# Altium footprint library PcbLib_ICs.PcbLib: 317 footprints (part 12 of 24)
Each footprint in its own frame and in the unit in brackets; x right, y up, seen from the top. Pads: shape width x height; smd on the part's side, far side on the other; paste and mask are expansions set on the pad; w line width, h text height; cw(c..) or ccw(c..) is an arc to the next point about the centre after c.
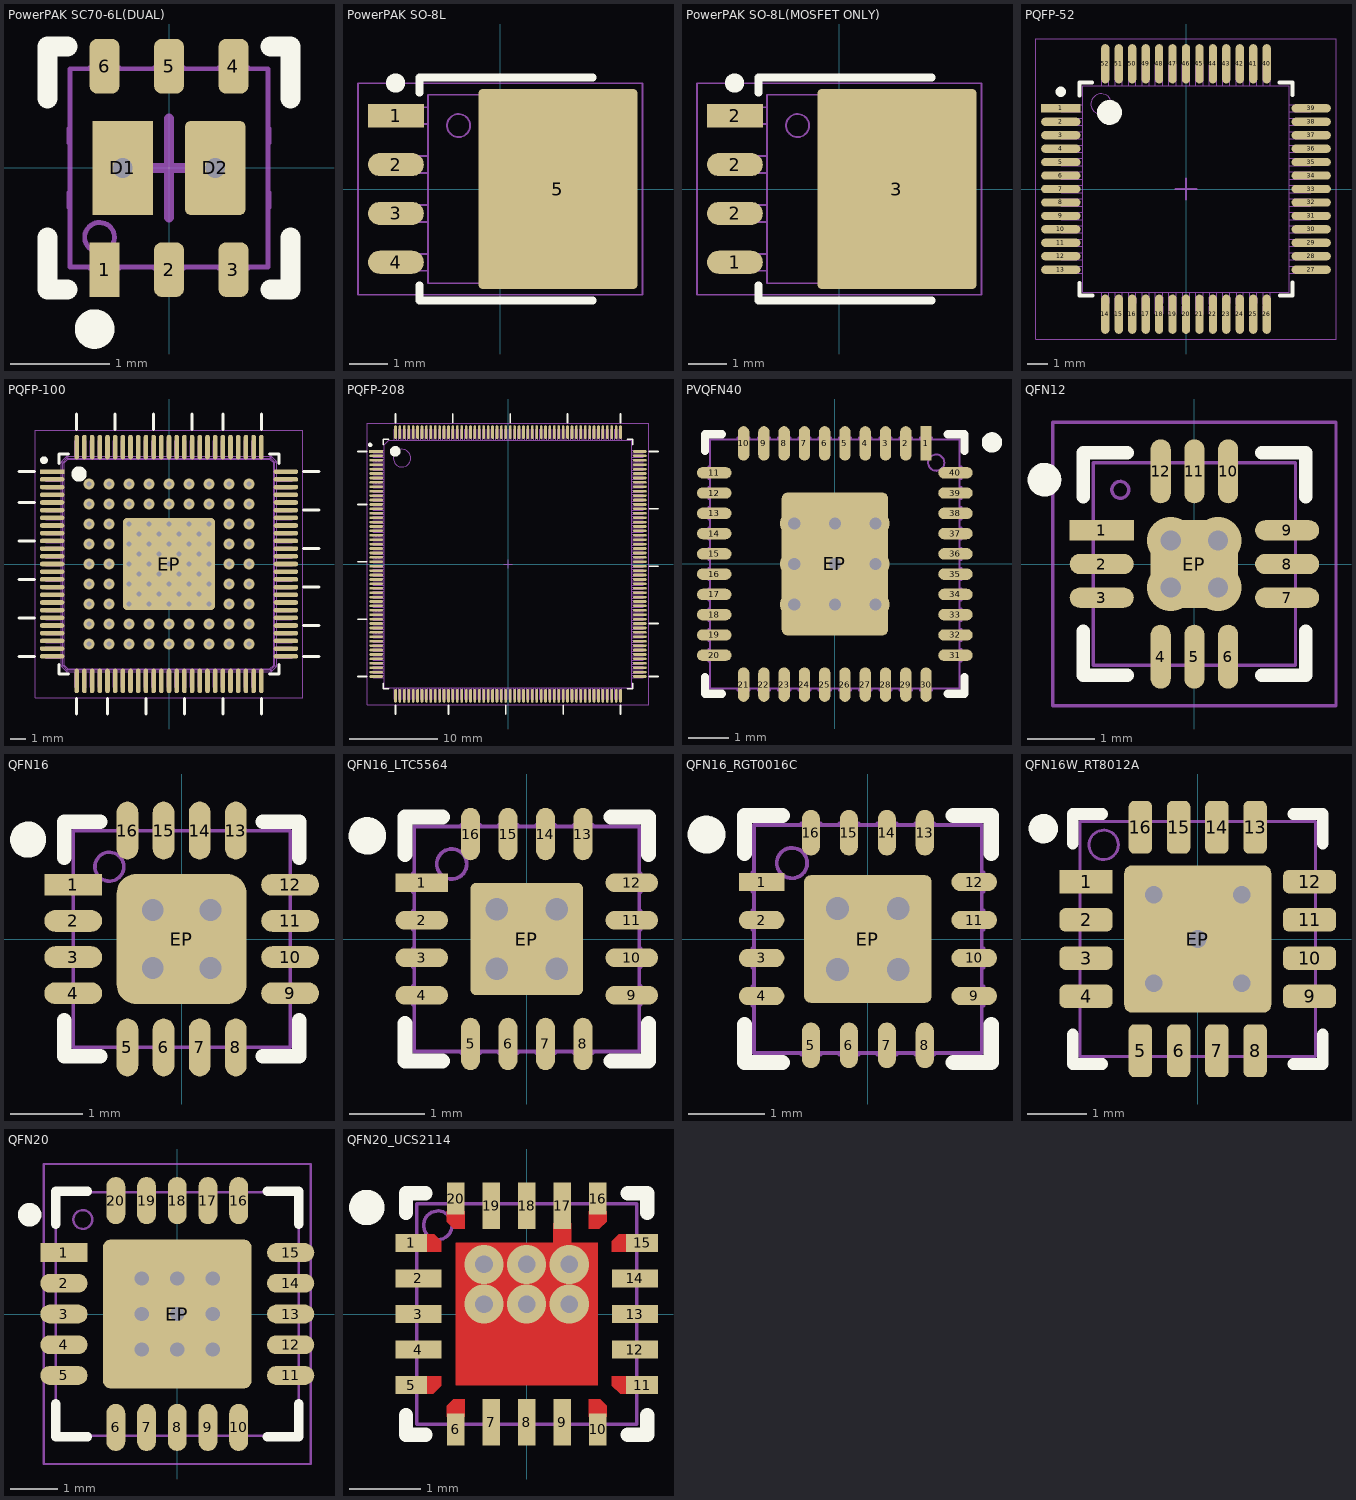
[diagram p11: the footprints below, top view; thin cyan lines are the x and y axes]

## PowerPAK SC70-6L(DUAL) [mm]
height 0.75
pads (8):
  rect 0.3x0.55 smd paste+0 mask+0.05: 1(-0.65,-1.025)
  rrect50% 0.3x0.55 smd paste+0 mask+0.05: 2(0,-1.025) 3(0.65,-1.025) 4(0.65,1.025) 5(0,1.025) 6(-0.65,1.025)
  rect 0.613x0.95 smd paste-2 mask+0.05: D1(-0.466,0)
  rrect20% 0.613x0.95 smd paste-2 mask+0.05: D2(0.466,0)
via -0.466,0 diameter 0.5 hole 0.2
via 0.466,0 diameter 0.5 hole 0.2
Top Overlay:
  circle w0.2: c-0.75,-1.625 r0.1
  lines w0.2: -1.225,-0.7 -1.225,-1.225 -1.025,-1.225 ; -1.225,0.7 -1.225,1.225 -1.025,1.225 ; 1.025,-1.225 1.225,-1.225 1.225,-0.7 ; 1.025,1.225 1.225,1.225 1.225,0.7
Top Paste:
  rectangle: 0.132,-0.5 0.797,0.5
  rectangle: -0.8,-0.5 -0.135,0.5
Top Assy:
  circle w0.05: c-0.7,-0.7 r0.15
  lines w0.05: -1,-0.4 -1.01,-0.4 -1.01,-0.25 -1,-0.25 ; -1,0.25 -1.01,0.25 -1.01,0.4 -1,0.4 ; -0.8,-1 -0.8,-1.01 -0.5,-1.01 -0.5,-1 ; -0.8,1 -0.8,1.01 -0.5,1.01 -0.5,1 ; -0.15,-1 -0.15,-1.01 0.15,-1.01 0.15,-1 ; -0.15,1 -0.15,1.01 0.15,1.01 0.15,1 ; 0.5,-1 0.5,-1.01 0.8,-1.01 0.8,-1 ; 0.5,1 0.5,1.01 0.8,1.01 0.8,1 ; 1,-0.4 1.01,-0.4 1.01,-0.25 1,-0.25 ; 1,0.25 1.01,0.25 1.01,0.4 1,0.4 ; -1,-1 -1,1 1,1 1,-1 -1,-1
  text ".Designator" at -2.579,-0.349 h1.5
Top Text:
  lines w0.1: -0.5,0 0.5,0 ; 0,-0.5 0,0.5
3D body "PowerPAK_SC70_6L.STEP": height 0.75, standoff -0.01, extent -1.025,-1.035 1.025,1.035

## PowerPAK SO-8L [mm] "PowerPAK SO-8L single package"
height 1.75
pads (5):
  rect 1.45x0.6 smd paste+0 mask+0.05: 1(-2.715,1.905)
  oval 1.45x0.6 smd paste+0 mask+0.05: 2(-2.715,0.635) 3(-2.715,-0.635) 4(-2.715,-1.905)
  rrect5% 4.13x5.2 smd paste-5 mask+0.05: 5(1.5,0)
Top Overlay:
  circle w0.25: c-2.725,2.755 r0.125
  lines w0.2: -2.1,-2.5 -2.1,-2.9 2.4,-2.9 ; -2.1,2.5 -2.1,2.9 2.4,2.9
Top Paste:
  rectangle: -0.4,1.6 0.4,2.4
  rectangle: 0.6,1.6 1.4,2.4
  rectangle: 0.6,0.6 1.4,1.4
  rectangle: -0.4,0.6 0.4,1.4
  rectangle: 0.6,-0.4 1.4,0.4
  rectangle: -0.4,-0.4 0.4,0.4
  region: 3.4,2.4 2.6,2.4 2.6,1.6 3.4,1.6
  region: 2.4,2.4 1.6,2.4 1.6,1.6 2.4,1.6
  region: 2.4,1.4 1.6,1.4 1.6,0.6 2.4,0.6
  region: 3.4,1.4 2.6,1.4 2.6,0.6 3.4,0.6
  region: 2.4,0.4 1.6,0.4 1.6,-0.4 2.4,-0.4
  region: 3.4,0.4 2.6,0.4 2.6,-0.4 3.4,-0.4
  rectangle: -0.4,-1.4 0.4,-0.6
  rectangle: 0.6,-1.4 1.4,-0.6
  rectangle: 0.6,-2.4 1.4,-1.6
  rectangle: -0.4,-2.4 0.4,-1.6
  region: 3.4,-0.6 2.6,-0.6 2.6,-1.4 3.4,-1.4
  region: 2.4,-0.6 1.6,-0.6 1.6,-1.4 2.4,-1.4
  region: 2.4,-1.6 1.6,-1.6 1.6,-2.4 2.4,-2.4
  region: 3.4,-1.6 2.6,-1.6 2.6,-2.4 3.4,-2.4
Top Assy:
  circle w0.05: c-1.085,1.65 r0.3
  lines w0.05: -1.885,-2.125 -2.244,-2.125 ; -1.885,-1.685 -2.244,-1.685 ; -1.885,-0.855 -2.244,-0.855 ; -1.885,-0.415 -2.244,-0.415 ; -1.885,0.415 -2.244,0.415 ; -1.885,0.855 -2.244,0.855 ; -1.885,1.685 -2.244,1.685 ; -1.885,2.125 -2.244,2.125 ; 0.125,-2.45 0.125,-2.56 0.235,-2.56 0.235,-2.45 ; 0.125,2.45 0.125,2.56 0.235,2.56 0.235,2.45 ; 2.485,-1.98 2.785,-1.98 2.785,-2.45 3.195,-2.45 3.195,2.45 2.785,2.45 2.785,1.98 2.485,1.98 ; 2.485,-1.52 2.785,-1.52 2.785,1.52 2.485,1.52 ; -2.633,-2.125 -2.544,-2.125 ; -2.633,-2.125 -2.955,-2.125 -2.955,-1.685 -2.633,-1.685 ; -2.633,-2.125 -2.633,-1.685 ; -2.633,-1.685 -2.544,-1.685 ; -2.633,-0.855 -2.544,-0.855 ; -2.633,-0.855 -2.955,-0.855 -2.955,-0.415 -2.633,-0.415 ; -2.633,-0.855 -2.633,-0.415 ; -2.633,-0.415 -2.544,-0.415 ; -2.633,0.415 -2.544,0.415 ; -2.633,0.415 -2.955,0.415 -2.955,0.855 -2.633,0.855 ; -2.633,0.415 -2.633,0.855 ; -2.633,0.855 -2.544,0.855 ; -2.633,1.685 -2.544,1.685 ; -2.633,1.685 -2.955,1.685 -2.955,2.125 -2.633,2.125 ; -2.633,1.685 -2.633,2.125 ; -2.633,2.125 -2.544,2.125 ; -2.544,-2.125 -2.333,-2.125 ; -2.544,-2.125 -2.544,-1.685 ; -2.544,-1.685 -2.333,-1.685 ; -2.544,-0.855 -2.333,-0.855 ; -2.544,-0.855 -2.544,-0.415 ; -2.544,-0.415 -2.333,-0.415 ; -2.544,0.415 -2.333,0.415 ; -2.544,0.415 -2.544,0.855 ; -2.544,0.855 -2.333,0.855 ; -2.544,1.685 -2.333,1.685 ; -2.544,1.685 -2.544,2.125 ; -2.544,2.125 -2.333,2.125 ; -2.333,-2.125 -2.244,-2.125 ; -2.333,-2.125 -2.333,-1.685 ; -2.333,-1.685 -2.244,-1.685 ; -2.333,-0.855 -2.244,-0.855 ; -2.333,-0.855 -2.333,-0.415 ; -2.333,-0.415 -2.244,-0.415 ; -2.333,0.415 -2.244,0.415 ; -2.333,0.415 -2.333,0.855 ; -2.333,0.855 -2.244,0.855 ; -2.333,1.685 -2.244,1.685 ; -2.333,1.685 -2.333,2.125 ; -2.333,2.125 -2.244,2.125 ; -2.244,-2.125 -2.244,-1.685 ; -2.244,-0.855 -2.244,-0.415 ; -2.244,0.415 -2.244,0.855 ; -2.244,1.685 -2.244,2.125 ; -1.885,-2.45 2.485,-2.45 2.485,2.45 -1.885,2.45 -1.885,-2.45
  text ".Designator" at -3.443,-0.467 h2
Top Text:
  lines w0.05: -3.7,-2.75 -3.7,2.75 3.7,2.75 3.7,-2.75 -3.7,-2.75
  lines w0.1: -0.5,0 0.5,0 ; 0,-0.5 0,0.5
3D body "User Library-PowerPAK_SO-8L_SINGLE.STEP": height 1.1, standoff 0.03, extent -2.955,-2.56 3.195,2.56

## PowerPAK SO-8L(MOSFET ONLY) [mm] "PowerPAK SO-8L single package (1-S,2-G,3-D)"
height 1.75
pads (5):
  oval 1.45x0.6 smd paste+0 mask+0.05: 1(-2.715,-1.905) 2(-2.715,-0.635) 2(-2.715,0.635)
  rect 1.45x0.6 smd paste+0 mask+0.05: 2(-2.715,1.905)
  rrect5% 4.13x5.2 smd paste-5 mask+0.05: 3(1.5,0)
Top Overlay:
  circle w0.25: c-2.725,2.755 r0.125
  lines w0.2: -2.1,-2.5 -2.1,-2.9 2.4,-2.9 ; -2.1,2.5 -2.1,2.9 2.4,2.9
Top Paste:
  rectangle: -0.4,1.6 0.4,2.4
  rectangle: 0.6,1.6 1.4,2.4
  rectangle: 0.6,0.6 1.4,1.4
  rectangle: -0.4,0.6 0.4,1.4
  rectangle: 0.6,-0.4 1.4,0.4
  rectangle: -0.4,-0.4 0.4,0.4
  region: 3.4,2.4 2.6,2.4 2.6,1.6 3.4,1.6
  region: 2.4,2.4 1.6,2.4 1.6,1.6 2.4,1.6
  region: 2.4,1.4 1.6,1.4 1.6,0.6 2.4,0.6
  region: 3.4,1.4 2.6,1.4 2.6,0.6 3.4,0.6
  region: 2.4,0.4 1.6,0.4 1.6,-0.4 2.4,-0.4
  region: 3.4,0.4 2.6,0.4 2.6,-0.4 3.4,-0.4
  rectangle: -0.4,-1.4 0.4,-0.6
  rectangle: 0.6,-1.4 1.4,-0.6
  rectangle: 0.6,-2.4 1.4,-1.6
  rectangle: -0.4,-2.4 0.4,-1.6
  region: 3.4,-0.6 2.6,-0.6 2.6,-1.4 3.4,-1.4
  region: 2.4,-0.6 1.6,-0.6 1.6,-1.4 2.4,-1.4
  region: 2.4,-1.6 1.6,-1.6 1.6,-2.4 2.4,-2.4
  region: 3.4,-1.6 2.6,-1.6 2.6,-2.4 3.4,-2.4
Top Assy:
  circle w0.05: c-1.085,1.65 r0.3
  lines w0.05: -1.885,-2.125 -2.244,-2.125 ; -1.885,-1.685 -2.244,-1.685 ; -1.885,-0.855 -2.244,-0.855 ; -1.885,-0.415 -2.244,-0.415 ; -1.885,0.415 -2.244,0.415 ; -1.885,0.855 -2.244,0.855 ; -1.885,1.685 -2.244,1.685 ; -1.885,2.125 -2.244,2.125 ; 0.125,-2.45 0.125,-2.56 0.235,-2.56 0.235,-2.45 ; 0.125,2.45 0.125,2.56 0.235,2.56 0.235,2.45 ; 2.485,-1.98 2.785,-1.98 2.785,-2.45 3.195,-2.45 3.195,2.45 2.785,2.45 2.785,1.98 2.485,1.98 ; 2.485,-1.52 2.785,-1.52 2.785,1.52 2.485,1.52 ; -2.633,-2.125 -2.544,-2.125 ; -2.633,-2.125 -2.955,-2.125 -2.955,-1.685 -2.633,-1.685 ; -2.633,-2.125 -2.633,-1.685 ; -2.633,-1.685 -2.544,-1.685 ; -2.633,-0.855 -2.544,-0.855 ; -2.633,-0.855 -2.955,-0.855 -2.955,-0.415 -2.633,-0.415 ; -2.633,-0.855 -2.633,-0.415 ; -2.633,-0.415 -2.544,-0.415 ; -2.633,0.415 -2.544,0.415 ; -2.633,0.415 -2.955,0.415 -2.955,0.855 -2.633,0.855 ; -2.633,0.415 -2.633,0.855 ; -2.633,0.855 -2.544,0.855 ; -2.633,1.685 -2.544,1.685 ; -2.633,1.685 -2.955,1.685 -2.955,2.125 -2.633,2.125 ; -2.633,1.685 -2.633,2.125 ; -2.633,2.125 -2.544,2.125 ; -2.544,-2.125 -2.333,-2.125 ; -2.544,-2.125 -2.544,-1.685 ; -2.544,-1.685 -2.333,-1.685 ; -2.544,-0.855 -2.333,-0.855 ; -2.544,-0.855 -2.544,-0.415 ; -2.544,-0.415 -2.333,-0.415 ; -2.544,0.415 -2.333,0.415 ; -2.544,0.415 -2.544,0.855 ; -2.544,0.855 -2.333,0.855 ; -2.544,1.685 -2.333,1.685 ; -2.544,1.685 -2.544,2.125 ; -2.544,2.125 -2.333,2.125 ; -2.333,-2.125 -2.244,-2.125 ; -2.333,-2.125 -2.333,-1.685 ; -2.333,-1.685 -2.244,-1.685 ; -2.333,-0.855 -2.244,-0.855 ; -2.333,-0.855 -2.333,-0.415 ; -2.333,-0.415 -2.244,-0.415 ; -2.333,0.415 -2.244,0.415 ; -2.333,0.415 -2.333,0.855 ; -2.333,0.855 -2.244,0.855 ; -2.333,1.685 -2.244,1.685 ; -2.333,1.685 -2.333,2.125 ; -2.333,2.125 -2.244,2.125 ; -2.244,-2.125 -2.244,-1.685 ; -2.244,-0.855 -2.244,-0.415 ; -2.244,0.415 -2.244,0.855 ; -2.244,1.685 -2.244,2.125 ; -1.885,-2.45 2.485,-2.45 2.485,2.45 -1.885,2.45 -1.885,-2.45
  text ".Designator" at -3.443,-0.467 h2
Top Text:
  lines w0.05: -3.7,-2.75 -3.7,2.75 3.7,2.75 3.7,-2.75 -3.7,-2.75
  lines w0.1: -0.5,0 0.5,0 ; 0,-0.5 0,0.5
3D body "User Library-PowerPAK_SO-8L_SINGLE.STEP": height 1.1, standoff 0.03, extent -2.955,-2.56 3.195,2.56

## PQFP-52 [mm] "QFP, 52-Leads, Body 10,00x10,00mm, Pitch 0,65mm, IPC Medium Density"
height 2.7
pads (52):
  rect 1.9x0.4 smd paste+0 mask+0.05: 1(-6.05,3.9)
  oval 1.9x0.4 smd paste+0 mask+0.05: 2(-6.05,3.25) 3(-6.05,2.6) 4(-6.05,1.95) 5(-6.05,1.3) 6(-6.05,0.65) 7(-6.05,0) 8(-6.05,-0.65) 9(-6.05,-1.3) 10(-6.05,-1.95) 11(-6.05,-2.6) 12(-6.05,-3.25) 13(-6.05,-3.9) 27(6.05,-3.9) 28(6.05,-3.25) 29(6.05,-2.6) 30(6.05,-1.95) 31(6.05,-1.3) 32(6.05,-0.65) 33(6.05,0) 34(6.05,0.65) 35(6.05,1.3) 36(6.05,1.95) 37(6.05,2.6) 38(6.05,3.25) 39(6.05,3.9)
  oval 0.4x1.9 smd paste+0 mask+0.05: 14(-3.9,-6.05) 15(-3.25,-6.05) 16(-2.6,-6.05) 17(-1.95,-6.05) 18(-1.3,-6.05) 19(-0.65,-6.05) 20(0,-6.05) 21(0.65,-6.05) 22(1.3,-6.05) 23(1.95,-6.05) 24(2.6,-6.05) 25(3.25,-6.05) 26(3.9,-6.05) 40(3.9,6.05) 41(3.25,6.05) 42(2.6,6.05) 43(1.95,6.05) 44(1.3,6.05) 45(0.65,6.05) 46(0,6.05) 47(-0.65,6.05) 48(-1.3,6.05) 49(-1.95,6.05) 50(-2.6,6.05) 51(-3.25,6.05) 52(-3.9,6.05)
Top Overlay:
  circle w0.6: c-3.7,3.7 r0.3
  circle w0.25: c-6.05,4.7 r0.125
  lines w0.2: -5.15,-4.55 -5.15,-5.15 -4.525,-5.15 ; -5.15,4.525 -5.15,5.15 -4.55,5.15 ; 4.525,5.15 5.15,5.15 5.15,4.55 ; 4.55,-5.15 5.15,-5.15 5.15,-4.525
Top Assy:
  drawing of 837 lines, arcs and shapes, not listed
  text ".Designator" at -3.443,-0.467 h2
Top Text:
  lines w0.05: -7.25,-7.25 7.25,-7.25 7.25,7.25 -7.25,7.25 -7.25,-7.25
  lines w0.1: -0.5,0 0.5,0 ; 0,-0.5 0,0.5
3D body "QFP65P1320X1320X270-52N.step": height 2.7, standoff 0, extent -6.6,-6.6 6.6,6.6

## PQFP-100 [mm] "PQFP, 100-Leads, Body 14,00x14,00mm, Pitch 0,50mm, IPC Medium Density"
height 1.6
pads (101):
  rect 1.6x0.3 smd paste+0 mask+0.05: 1(-7.6,6)
  oval 1.6x0.3 smd paste+0 mask+0.05: 2(-7.6,5.5) 3(-7.6,5) 4(-7.6,4.5) 5(-7.6,4) 6(-7.6,3.5) 7(-7.6,3) 8(-7.6,2.5) 9(-7.6,2) 10(-7.6,1.5) 11(-7.6,1) 12(-7.6,0.5) 13(-7.6,0) 14(-7.6,-0.5) 15(-7.6,-1) 16(-7.6,-1.5) 17(-7.6,-2) 18(-7.6,-2.5) 19(-7.6,-3) 20(-7.6,-3.5) 21(-7.6,-4) 22(-7.6,-4.5) 23(-7.6,-5) 24(-7.6,-5.5) 25(-7.6,-6) 51(7.6,-6) 52(7.6,-5.5) 53(7.6,-5) 54(7.6,-4.5) 55(7.6,-4) 56(7.6,-3.5) 57(7.6,-3) 58(7.6,-2.5) 59(7.6,-2) 60(7.6,-1.5) 61(7.6,-1) 62(7.6,-0.5) 63(7.6,0) 64(7.6,0.5) 65(7.6,1) 66(7.6,1.5) 67(7.6,2) 68(7.6,2.5) 69(7.6,3) 70(7.6,3.5) 71(7.6,4) 72(7.6,4.5) 73(7.6,5) 74(7.6,5.5) 75(7.6,6)
  oval 0.3x1.6 smd paste+0 mask+0.05: 26(-6,-7.6) 27(-5.5,-7.6) 28(-5,-7.6) 29(-4.5,-7.6) 30(-4,-7.6) 31(-3.5,-7.6) 32(-3,-7.6) 33(-2.5,-7.6) 34(-2,-7.6) 35(-1.5,-7.6) 36(-1,-7.6) 37(-0.5,-7.6) 38(0,-7.6) 39(0.5,-7.6) 40(1,-7.6) 41(1.5,-7.6) 42(2,-7.6) 43(2.5,-7.6) 44(3,-7.6) 45(3.5,-7.6) 46(4,-7.6) 47(4.5,-7.6) 48(5,-7.6) 49(5.5,-7.6) 50(6,-7.6) 76(6,7.6) 77(5.5,7.6) 78(5,7.6) 79(4.5,7.6) 80(4,7.6) 81(3.5,7.6) 82(3,7.6) 83(2.5,7.6) 84(2,7.6) 85(1.5,7.6) 86(1,7.6) 87(0.5,7.6) 88(0,7.6) 89(-0.5,7.6) 90(-1,7.6) 91(-1.5,7.6) 92(-2,7.6) 93(-2.5,7.6) 94(-3,7.6) 95(-3.5,7.6) 96(-4,7.6) 97(-4.5,7.6) 98(-5,7.6) 99(-5.5,7.6) 100(-6,7.6)
  rrect10% 6x6 smd paste-50 mask+0.05: EP(0,0)
via -1.95,-1.95 diameter 0.7 hole 0.3
via -0.65,-1.95 diameter 0.7 hole 0.3
via 0.65,-1.95 diameter 0.7 hole 0.3
via 1.95,-1.95 diameter 0.7 hole 0.3
via 1.95,-0.65 diameter 0.7 hole 0.3
via 0.65,-0.65 diameter 0.7 hole 0.3
via -0.65,-0.65 diameter 0.7 hole 0.3
via -1.95,-0.65 diameter 0.7 hole 0.3
via -1.95,0.65 diameter 0.7 hole 0.3
via -0.65,0.65 diameter 0.7 hole 0.3
via 0.65,0.65 diameter 0.7 hole 0.3
via 1.95,0.65 diameter 0.7 hole 0.3
via 1.95,1.95 diameter 0.7 hole 0.3
via 0.65,1.95 diameter 0.7 hole 0.3
via -0.65,1.95 diameter 0.7 hole 0.3
via -1.95,1.95 diameter 0.7 hole 0.3
via 5.2,-5.2 diameter 0.7 hole 0.3
via 3.9,-5.2 diameter 0.7 hole 0.3
via 2.6,-5.2 diameter 0.7 hole 0.3
via 1.3,-5.2 diameter 0.7 hole 0.3
via 0,-5.2 diameter 0.7 hole 0.3
via -1.3,-5.2 diameter 0.7 hole 0.3
via -2.6,-5.2 diameter 0.7 hole 0.3
via -3.9,-5.2 diameter 0.7 hole 0.3
via -5.2,-5.2 diameter 0.7 hole 0.3
via 5.2,5.2 diameter 0.7 hole 0.3
via 5.2,3.9 diameter 0.7 hole 0.3
via 3.9,3.9 diameter 0.7 hole 0.3
via 3.9,5.2 diameter 0.7 hole 0.3
via 2.6,5.2 diameter 0.7 hole 0.3
via 2.6,3.9 diameter 0.7 hole 0.3
via 1.3,3.9 diameter 0.7 hole 0.3
via 1.3,5.2 diameter 0.7 hole 0.3
via 0,5.2 diameter 0.7 hole 0.3
via 0,3.9 diameter 0.7 hole 0.3
via -1.3,3.9 diameter 0.7 hole 0.3
via -1.3,5.2 diameter 0.7 hole 0.3
via -2.6,3.9 diameter 0.7 hole 0.3
via -2.6,5.2 diameter 0.7 hole 0.3
via 3.9,2.6 diameter 0.7 hole 0.3
via 5.2,2.6 diameter 0.7 hole 0.3
via 5.2,1.3 diameter 0.7 hole 0.3
via 3.9,1.3 diameter 0.7 hole 0.3
via 3.9,0 diameter 0.7 hole 0.3
via 5.2,0 diameter 0.7 hole 0.3
via 5.2,-1.3 diameter 0.7 hole 0.3
via 3.9,-1.3 diameter 0.7 hole 0.3
via 3.9,-2.6 diameter 0.7 hole 0.3
via 5.2,-2.6 diameter 0.7 hole 0.3
via 5.2,-3.9 diameter 0.7 hole 0.3
via 3.9,-3.9 diameter 0.7 hole 0.3
via 2.6,-3.9 diameter 0.7 hole 0.3
via 1.3,-3.9 diameter 0.7 hole 0.3
via 0,-3.9 diameter 0.7 hole 0.3
via -1.3,-3.9 diameter 0.7 hole 0.3
via -2.6,-3.9 diameter 0.7 hole 0.3
via -3.9,-3.9 diameter 0.7 hole 0.3
via -5.2,-3.9 diameter 0.7 hole 0.3
via -5.2,-2.6 diameter 0.7 hole 0.3
via -3.9,-2.6 diameter 0.7 hole 0.3
via -3.9,-1.3 diameter 0.7 hole 0.3
via -5.2,-1.3 diameter 0.7 hole 0.3
via -3.9,0 diameter 0.7 hole 0.3
via -5.2,0 diameter 0.7 hole 0.3
via -5.2,1.3 diameter 0.7 hole 0.3
via -3.9,1.3 diameter 0.7 hole 0.3
via -3.9,2.6 diameter 0.7 hole 0.3
via -5.2,2.6 diameter 0.7 hole 0.3
via -5.2,3.9 diameter 0.7 hole 0.3
via -3.9,3.9 diameter 0.7 hole 0.3
via -3.9,5.2 diameter 0.7 hole 0.3
via -5.2,5.2 diameter 0.7 hole 0.3
via -2.6,-1.3 diameter 0.7 hole 0.3
via -2.6,0 diameter 0.7 hole 0.3
via -2.6,1.3 diameter 0.7 hole 0.3
via -2.6,2.6 diameter 0.7 hole 0.3
via -1.3,2.6 diameter 0.7 hole 0.3
via 0,2.6 diameter 0.7 hole 0.3
via 1.3,2.6 diameter 0.7 hole 0.3
via 2.6,2.6 diameter 0.7 hole 0.3
via 2.6,1.3 diameter 0.7 hole 0.3
via 2.6,0 diameter 0.7 hole 0.3
via 2.6,-1.3 diameter 0.7 hole 0.3
via 2.6,-2.6 diameter 0.7 hole 0.3
via 1.3,-2.6 diameter 0.7 hole 0.3
via 0,-2.6 diameter 0.7 hole 0.3
via -1.3,-2.6 diameter 0.7 hole 0.3
via -2.6,-2.6 diameter 0.7 hole 0.3
via -1.3,-1.3 diameter 0.7 hole 0.3
via 0,-1.3 diameter 0.7 hole 0.3
via 1.3,-1.3 diameter 0.7 hole 0.3
via 1.3,0 diameter 0.7 hole 0.3
via 1.3,1.3 diameter 0.7 hole 0.3
via 0,1.3 diameter 0.7 hole 0.3
via -1.3,1.3 diameter 0.7 hole 0.3
via -1.3,0 diameter 0.7 hole 0.3
via 0,0 diameter 0.7 hole 0.3
Top Overlay:
  circle w0.25: c-8.125,6.75 r0.125
  circle w0.6: c-5.85,5.85 r0.2
  lines w0.2: -9.75,-6 -8.75,-6 ; -9.75,-3.5 -8.75,-3.5 ; -9.75,-1 -8.75,-1 ; -9.75,1.5 -8.75,1.5 ; -9.75,4 -8.75,4 ; -9.75,6 -8.75,6 ; -7.15,-6.55 -7.15,-7.15 -6.525,-7.15 ; -7.15,6.525 -7.15,7.15 -6.55,7.15 ; -6,-9.75 -6,-8.75 ; -6,8.75 -6,9.75 ; -4,-9.75 -4,-8.75 ; -3.5,8.75 -3.5,9.75 ; -1.5,-9.75 -1.5,-8.75 ; -1,8.75 -1,9.75 ; 1,-9.75 1,-8.75 ; 1.5,8.75 1.5,9.75 ; 3.5,-9.75 3.5,-8.75 ; 3.5,8.75 3.5,9.75 ; 6,-9.75 6,-8.75 ; 6,8.75 6,9.75 ; 6.525,7.15 7.15,7.15 7.15,6.55 ; 6.55,-7.15 7.15,-7.15 7.15,-6.525 ; 8.75,-6 9.75,-6 ; 8.75,-4 9.75,-4 ; 8.75,-1.5 9.75,-1.5 ; 8.75,1 9.75,1 ; 8.75,3.5 9.75,3.5 ; 8.75,6 9.75,6
Top Paste:
  rectangle: 2.5,-3.1 3.1,-2.5
  rectangle: 0.9,-3.1 1.5,-2.5
  rectangle: 1.7,-3.1 2.3,-2.5
  rectangle: -3.1,-3.1 -2.5,-2.5
  rectangle: -2.3,-3.1 -1.7,-2.5
  rectangle: -1.5,-3.1 -0.9,-2.5
  rectangle: -0.7,-3.1 -0.1,-2.5
  rectangle: 0.1,-3.1 0.7,-2.5
  rectangle: 2.5,-2.3 3.1,-1.7
  rectangle: 0.9,-2.3 1.5,-1.7
  rectangle: 1.7,-2.3 2.3,-1.7
  rectangle: -3.1,-2.3 -2.5,-1.7
  rectangle: -2.3,-2.3 -1.7,-1.7
  rectangle: -1.5,-2.3 -0.9,-1.7
  rectangle: -0.7,-2.3 -0.1,-1.7
  rectangle: 0.1,-2.3 0.7,-1.7
  rectangle: 2.5,-1.5 3.1,-0.9
  rectangle: 0.9,-1.5 1.5,-0.9
  rectangle: 1.7,-1.5 2.3,-0.9
  rectangle: -3.1,-1.5 -2.5,-0.9
  rectangle: -2.3,-1.5 -1.7,-0.9
  rectangle: -1.5,-1.5 -0.9,-0.9
  rectangle: -0.7,-1.5 -0.1,-0.9
  rectangle: 0.1,-1.5 0.7,-0.9
  region: -2.5,3.1 -3.1,3.1 -3.1,2.5 -2.5,2.5
  region: -0.9,3.1 -1.5,3.1 -1.5,2.5 -0.9,2.5
  region: -1.7,3.1 -2.3,3.1 -2.3,2.5 -1.7,2.5
  region: 3.1,3.1 2.5,3.1 2.5,2.5 3.1,2.5
  region: 2.3,3.1 1.7,3.1 1.7,2.5 2.3,2.5
  region: 1.5,3.1 0.9,3.1 0.9,2.5 1.5,2.5
  region: 0.7,3.1 0.1,3.1 0.1,2.5 0.7,2.5
  region: -0.1,3.1 -0.7,3.1 -0.7,2.5 -0.1,2.5
  region: -2.5,2.3 -3.1,2.3 -3.1,1.7 -2.5,1.7
  region: -0.9,2.3 -1.5,2.3 -1.5,1.7 -0.9,1.7
  region: -1.7,2.3 -2.3,2.3 -2.3,1.7 -1.7,1.7
  region: 3.1,2.3 2.5,2.3 2.5,1.7 3.1,1.7
  region: 2.3,2.3 1.7,2.3 1.7,1.7 2.3,1.7
  region: 1.5,2.3 0.9,2.3 0.9,1.7 1.5,1.7
  region: 0.7,2.3 0.1,2.3 0.1,1.7 0.7,1.7
  region: -0.1,2.3 -0.7,2.3 -0.7,1.7 -0.1,1.7
  region: -2.5,1.5 -3.1,1.5 -3.1,0.9 -2.5,0.9
  region: -0.9,1.5 -1.5,1.5 -1.5,0.9 -0.9,0.9
  region: -1.7,1.5 -2.3,1.5 -2.3,0.9 -1.7,0.9
  region: 3.1,1.5 2.5,1.5 2.5,0.9 3.1,0.9
  region: 2.3,1.5 1.7,1.5 1.7,0.9 2.3,0.9
  region: 1.5,1.5 0.9,1.5 0.9,0.9 1.5,0.9
  region: 0.7,1.5 0.1,1.5 0.1,0.9 0.7,0.9
  region: -0.1,1.5 -0.7,1.5 -0.7,0.9 -0.1,0.9
  rectangle: -3.1,-0.7 -2.5,-0.1
  region: -2.5,0.7 -3.1,0.7 -3.1,0.1 -2.5,0.1
  rectangle: -2.3,-0.7 -1.7,-0.1
  rectangle: -1.5,-0.7 -0.9,-0.1
  region: -0.9,0.7 -1.5,0.7 -1.5,0.1 -0.9,0.1
  region: -1.7,0.7 -2.3,0.7 -2.3,0.1 -1.7,0.1
  region: 3.1,0.7 2.5,0.7 2.5,0.1 3.1,0.1
  rectangle: 2.5,-0.7 3.1,-0.1
  region: 2.3,0.7 1.7,0.7 1.7,0.1 2.3,0.1
  region: 1.5,0.7 0.9,0.7 0.9,0.1 1.5,0.1
  rectangle: 0.9,-0.7 1.5,-0.1
  rectangle: 1.7,-0.7 2.3,-0.1
  region: 0.7,0.7 0.1,0.7 0.1,0.1 0.7,0.1
  region: -0.1,0.7 -0.7,0.7 -0.7,0.1 -0.1,0.1
  rectangle: -0.7,-0.7 -0.1,-0.1
  rectangle: 0.1,-0.7 0.7,-0.1
Bottom Solder:
  region: -3.25,3.25 -0.65,3.25 0,2.6 0.65,3.25 3.25,3.251 3.25,0.65 2.6,0 3.25,-0.65 3.249,-3.25 0.65,-3.25 0,-2.6 -0.65,-3.25 -3.25,-3.249 -3.25,-0.65 -2.6,0 -3.25,0.65
Bottom Simple Assy:
  rectangle: -8.003,5.89 -7.003,6.11
  rectangle: -8.003,5.39 -7.003,5.61
  rectangle: -8.003,4.89 -7.003,5.11
  rectangle: -8.003,4.39 -7.003,4.61
  rectangle: -8.003,2.39 -7.003,2.61
  rectangle: -8.003,2.89 -7.003,3.11
  rectangle: -8.003,3.39 -7.003,3.61
  rectangle: -8.003,3.89 -7.003,4.11
  rectangle: -8.003,-0.11 -7.003,0.11
  rectangle: -8.003,-0.61 -7.003,-0.39
  rectangle: -8.003,-1.11 -7.003,-0.89
  rectangle: -8.003,-1.61 -7.003,-1.39
  rectangle: -8.003,0.39 -7.003,0.61
  rectangle: -8.003,0.89 -7.003,1.11
  rectangle: -8.003,1.39 -7.003,1.61
  rectangle: -8.003,1.89 -7.003,2.11
  rectangle: -8.003,-4.11 -7.003,-3.89
  rectangle: -8.003,-4.61 -7.003,-4.39
  rectangle: -8.003,-5.11 -7.003,-4.89
  rectangle: -8.003,-5.61 -7.003,-5.39
  rectangle: -8.003,-3.61 -7.003,-3.39
  rectangle: -8.003,-3.11 -7.003,-2.89
  rectangle: -8.003,-2.61 -7.003,-2.39
  rectangle: -8.003,-2.11 -7.003,-1.89
  rectangle: -8.003,-6.11 -7.003,-5.89
  region: 6.108,-8 6.108,-7 5.888,-7 5.888,-8
  region: 2.108,-8 2.108,-7 1.888,-7 1.888,-8
  region: 2.608,-8 2.608,-7 2.388,-7 2.388,-8
  region: 3.108,-8 3.108,-7 2.888,-7 2.888,-8
  region: 3.608,-8 3.608,-7 3.388,-7 3.388,-8
  region: 5.608,-8 5.608,-7 5.388,-7 5.388,-8
  region: 5.108,-8 5.108,-7 4.888,-7 4.888,-8
  region: 4.608,-8 4.608,-7 4.388,-7 4.388,-8
  region: 4.108,-8 4.108,-7 3.888,-7 3.888,-8
  region: -1.892,-8 -1.892,-7 -2.112,-7 -2.112,-8
  region: -1.392,-8 -1.392,-7 -1.612,-7 -1.612,-8
  region: -0.892,-8 -0.892,-7 -1.112,-7 -1.112,-8
  region: -0.392,-8 -0.392,-7 -0.612,-7 -0.612,-8
  region: 1.608,-8 1.608,-7 1.388,-7 1.388,-8
  region: 1.108,-8 1.108,-7 0.888,-7 0.888,-8
  region: 0.608,-8 0.608,-7 0.388,-7 0.388,-8
  region: 0.108,-8 0.108,-7 -0.112,-7 -0.112,-8
  region: -3.892,-8 -3.892,-7 -4.112,-7 -4.112,-8
  region: -3.392,-8 -3.392,-7 -3.612,-7 -3.612,-8
  region: -2.892,-8 -2.892,-7 -3.112,-7 -3.112,-8
  region: -2.392,-8 -2.392,-7 -2.612,-7 -2.612,-8
  region: -4.392,-8 -4.392,-7 -4.612,-7 -4.612,-8
  region: -4.892,-8 -4.892,-7 -5.112,-7 -5.112,-8
  region: -5.392,-8 -5.392,-7 -5.612,-7 -5.612,-8
  region: -5.892,-8 -5.892,-7 -6.112,-7 -6.112,-8
  region: 7.998,6.11 6.998,6.11 6.998,5.89 7.998,5.89
  region: 7.998,2.11 6.998,2.11 6.998,1.89 7.998,1.89
  region: 7.998,2.61 6.998,2.61 6.998,2.39 7.998,2.39
  region: 7.998,3.11 6.998,3.11 6.998,2.89 7.998,2.89
  region: 7.998,3.61 6.998,3.61 6.998,3.39 7.998,3.39
  region: 7.998,5.61 6.998,5.61 6.998,5.39 7.998,5.39
  region: 7.998,5.11 6.998,5.11 6.998,4.89 7.998,4.89
  region: 7.998,4.61 6.998,4.61 6.998,4.39 7.998,4.39
  region: 7.998,4.11 6.998,4.11 6.998,3.89 7.998,3.89
  region: 7.998,-1.89 6.998,-1.89 6.998,-2.11 7.998,-2.11
  region: 7.998,-1.39 6.998,-1.39 6.998,-1.61 7.998,-1.61
  region: 7.998,-0.89 6.998,-0.89 6.998,-1.11 7.998,-1.11
  region: 7.998,-0.39 6.998,-0.39 6.998,-0.61 7.998,-0.61
  region: 7.998,1.61 6.998,1.61 6.998,1.39 7.998,1.39
  region: 7.998,1.11 6.998,1.11 6.998,0.89 7.998,0.89
  region: 7.998,0.61 6.998,0.61 6.998,0.39 7.998,0.39
  region: 7.998,0.11 6.998,0.11 6.998,-0.11 7.998,-0.11
  region: 7.998,-3.89 6.998,-3.89 6.998,-4.11 7.998,-4.11
  region: 7.998,-3.39 6.998,-3.39 6.998,-3.61 7.998,-3.61
  region: 7.998,-2.89 6.998,-2.89 6.998,-3.11 7.998,-3.11
  region: 7.998,-2.39 6.998,-2.39 6.998,-2.61 7.998,-2.61
  region: 7.998,-4.39 6.998,-4.39 6.998,-4.61 7.998,-4.61
  region: 7.998,-4.89 6.998,-4.89 6.998,-5.11 7.998,-5.11
  region: 7.998,-5.39 6.998,-5.39 6.998,-5.61 7.998,-5.61
  region: 7.998,-5.89 6.998,-5.89 6.998,-6.11 7.998,-6.11
  region: -6.112,8 -6.112,7 -5.892,7 -5.892,8
  region: -2.112,8 -2.112,7 -1.892,7 -1.892,8
  region: -2.612,8 -2.612,7 -2.392,7 -2.392,8
  region: -3.112,8 -3.112,7 -2.892,7 -2.892,8
  region: -3.612,8 -3.612,7 -3.392,7 -3.392,8
  region: -5.612,8 -5.612,7 -5.393,7 -5.393,8